# Altium schematic symbol library LUCHADOR SCHLIB.SchLib: 63 symbols (continued)
## LED0
designator D?
Typical INFRARED GaAs LED; Published: 8-Jun-2000; LatestRevisionDate: 08-Jul-2005; LatestRevisionNote: Mech Layer 1 removed.; PackageReference: LED-0; Publisher: Altium Limited; PackageDescription: LED; 2 Leads
footprint LED-0 (LED; 2 Leads)
simulation model LED0 (Diode)
pins: 1 A, 2 K

## LED0_1
designator D?  (value not drawn)
Typical INFRARED GaAs LED; Manufacturer: Vishay; Manufacturer Part Number: VLMO1500-GS08; Description1: Standard LEDs - SMD 0402 SOFT ORANGE Non-Diff; Illumination Color: Orange; Wavelength/Color Temperature: 605 nm; Luminous Intensity: 90 mcd; Viewing Angle: 130 deg; Lens Color/Style: Water Clear; If - Forward Current: 30 mA; Vf - Forward Voltage: 2 V; Power Rating: 75 mW; Brand: Vishay Semiconductors; Supplier 1: Digi-Key; Supplier Part Number 1: VLMO1500-GS08CT-ND; Stock 1: 194938; Pricing 1: 1=0.53, 10=0.38, 25=0.2916, 100=0.1901, 250=0.1394, 500=0.1183, 1000=0.0972 (USD); Product Category: Standard LEDs - SMD; RoHS: True; Package / Case: 0402 (1005 metric); Length: 1 mm; Height: 0.35 mm; Width: 0.5 mm; Minimum Operating Temperature: - 30 C; Maximum Operating Temperature: + 85 C; Series: VLMx; Packaging: Reel; Mounting Style: SMD/SMT; Factory Pack Quantity: 9000; Tradename: ChipLED; ComponentLink1URL: https://datasheet.ciiva.com/13945/vlmo1500-13945355.pdf; ComponentLink1Description: https://datasheet.ciiva.com/13945/vlmo1500-13945355.pdf; ComponentLink2URL: https://datasheet.ciiva.com/13945/vlmo1500-13945356.pdf; ComponentLink2Description: https://datasheet.ciiva.com/13945/vlmo1500-13945356.pdf; ComponentLink3URL: https://datasheet.ciiva.com/13945/vlmo1500-13945357.pdf; ComponentLink3Description: https://datasheet.ciiva.com/13945/vlmo1500-13945357.pdf
footprint 0402L-ORANGE (Footprint not found)
pins: 1 A, 2 K

## LED0_1_1
designator D31, comment STATUS
Typical INFRARED GaAs LED; Manufacturer: Vishay; Manufacturer Part Number: VLMO1500-GS08; Description1: Standard LEDs - SMD 0402 SOFT ORANGE Non-Diff; Illumination Color: Orange; Wavelength/Color Temperature: 605 nm; Luminous Intensity: 90 mcd; Viewing Angle: 130 deg; Lens Color/Style: Water Clear; If - Forward Current: 30 mA; Vf - Forward Voltage: 2 V; Power Rating: 75 mW; Brand: Vishay Semiconductors; Supplier 1: Digi-Key; Supplier Part Number 1: VLMO1500-GS08CT-ND; Stock 1: 194938; Pricing 1: 1=0.53, 10=0.38, 25=0.2916, 100=0.1901, 250=0.1394, 500=0.1183, 1000=0.0972 (USD); Product Category: Standard LEDs - SMD; RoHS: True; Package / Case: 0402 (1005 metric); Length: 1 mm; Height: 0.35 mm; Width: 0.5 mm; Minimum Operating Temperature: - 30 C; Maximum Operating Temperature: + 85 C; Series: VLMx; Packaging: Reel; Mounting Style: SMD/SMT; Factory Pack Quantity: 9000; Tradename: ChipLED; ComponentLink1URL: https://datasheet.ciiva.com/13945/vlmo1500-13945355.pdf; ComponentLink1Description: https://datasheet.ciiva.com/13945/vlmo1500-13945355.pdf; ComponentLink2URL: https://datasheet.ciiva.com/13945/vlmo1500-13945356.pdf; ComponentLink2Description: https://datasheet.ciiva.com/13945/vlmo1500-13945356.pdf; ComponentLink3URL: https://datasheet.ciiva.com/13945/vlmo1500-13945357.pdf; ComponentLink3Description: https://datasheet.ciiva.com/13945/vlmo1500-13945357.pdf
footprint 0402L-ORANGE (Footprint not found)
pins: 1 A, 2 K

## LM27762DSST
designator U?  Manufacturer Part Number: LM27762DSST
Manufacturer: Texas Instruments; Description1: Charge Pump Switching Regulator IC Positive and Negative (Dual Rail) Adjustable -5V, 1.5V 2 - Dual Output 250mA 12-WFDFN Exposed Pad; Function: Step-Up/Step-Down; Output Configuration: Positive and Negative (Dual Rail); Topology: Charge Pump; Output Type: Adjustable; Number of Outputs: 2 - Dual; Voltage - Input (Min): 2.7V; Voltage - Input (Max): 5.5V; Voltage - Output (Min/Fixed): -5V, 1.5V; Voltage - Output (Max): -1.5V, 5V; Current - Output: 250mA; Frequency - Switching: 1.7MHz ~ 2.3MHz; Synchronous Rectifier: No; Supplier 1: Digi-Key; Supplier Part Number 1: 296-44944-1-ND; Stock 1: 4423; Pricing 1: 1=2.43, 10=2.184, 100=1.7551 (USD); Category: Integrated Circuits (ICs); Family: PMIC - Voltage Regulators - DC DC Switching Regulators; Series: -; Packaging: Tape & Reel (TR); Part Status: Active; Operating Temperature: -40°C ~ 85°C (TA); Mounting Type: Surface Mount; Package / Case: 12-WFDFN Exposed Pad; Supplier Device Package: 12-WSON (3x2); ComponentLink1URL: http://www.ti.com/lit/ds/symlink/lm27762.pdf; ComponentLink1Description: http://www.ti.com/lit/ds/symlink/lm27762.pdf
footprint WFDFN-12 (Footprint not found)
pins: 1 PGOOD, 2 FB+, 3 VIN, 4 GND, 5 CP, 6 OUT-, 7 FB-, 8 EN-, 9 C1-, 10 C1+, 11 OUT+, 12 EN+, TP

## LTC1871EMS#TRPBF
designator U?
Manufacturer: Linear Technology; Description1: IC REG CTRLR MULT TOP 10MSOP; Output Type: Transistor Driver; Function: Step-Up, Step-Up/Step-Down; Output Configuration: Positive or Negative; Topology: Boost, Flyback, SEPIC; Number of Outputs: 1; Voltage - Supply (Vcc/Vdd): 2.5 V ~ 36 V; Frequency - Switching: 50kHz ~ 1MHz; Duty Cycle (Max): 92%; Synchronous Rectifier: No; Clock Sync: Yes; Control Features: Enable, Frequency Control; Supplier 1: Digi-Key; Supplier Part Number 1: LTC1871EMS#TRPBFCT-ND; RoHS: RoHS Compliant; Category: Integrated Circuits (ICs); Stock 1: 1092; Pricing 1: 1=6.19, 25=5.5276, 100=3.36, 250=3.08 (USD); Packaging: Cut Tape (CT); Part Status: Active; Output Phases: 1; Serial Interfaces: -; Operating Temperature: -40°C ~ 85°C (TA); Package / Case: 10-TFSOP, 10-MSOP (0.118", 3.00mm Width); Supplier Device Package: 10-MSOP; ComponentLink1URL: http://www.linear.com/docs/5240; ComponentLink1Description: http://www.linear.com/docs/5240; Manufacturer Part Number: LTC1871EMS#TRPBF
footprint MSOP-10 (Footprint not found)
pins: 1 RUN, 2 Ith, 3 FB, 4 FREQ, 5 MODE/SYNC, 6 GND (power), 7 GATE (out), 8 INTVcc (power), 9 Vin (power), 10 SENSE (in)

## M50-3552042
designator J?
Manufacturer: Harwin Inc.; Manufacturer Part Number: M50-3552042; Description1: 1.27 IDC PCB HEADER 40 POSN; Connector Type: Header, Shrouded; Number of Positions: 40; Number of Positions Loaded: All; Pitch: 0.050" (1.27mm); Supplier 1: Digi-Key; Supplier Part Number 1: 952-2622-ND; RoHS: RoHS Compliant; Category: Connectors, Interconnects; Stock 1: 139; Pricing 1: 1=4.16, 10=3.726, 100=3.0681, 500=2.42526, 1000=2.08193, 5000=1.8993, 10000=1.82625 (USD); Packaging: Tube; Part Status: Active; Contact Type: Male Pin; Number of Rows: 2; Row Spacing: 0.050" (1.27mm); Contact Mating Length: 0.120" (3.05mm); Mounting Type: Through Hole; Termination: Solder; Fastening Type: Latch Lock/Eject Hooks; Features: -; Contact Finish: Gold; Contact Finish Thickness: Flash; Color: Black; ComponentLink1URL: http://cdn.harwin.com/pdfs/M50-355.pdf; ComponentLink1Description: http://cdn.harwin.com/pdfs/M50-355.pdf
footprint M50-3552042 (Footprint not found)
pins: 1, 2, 3, 4, 5, 6, 7, 8, 9, 10, 11, 12, 13, 14, 15, 16, 17, 18, 19, 20, 21, 22, 23, 24, 25, 26, 27, 28, 29, 30, 31, 32, 33, 34, 35, 36, 37, 38, 39, 40

## MKL26Z256VLH4
designator U?
Manufacturer: Freescale Semiconductor - NXP; Description1: IC MCU 32BIT 256KB FLASH 64LQFP; Core Processor: ARM® Cortex®-M0+; Core Size: 32-Bit; Speed: 48MHz; Connectivity: I²C, LIN, SPI, UART/USART, USB, USB OTG; Peripherals: Brown-out Detect/Reset, DMA, I²S, LVD, POR, PWM, WDT; Number of I/O: 50; Program Memory Size: 256KB (256K x 8); Program Memory Type: FLASH; RAM Size: 32K x 8; Voltage - Supply (Vcc/Vdd): 1.71 V ~ 3.6 V; Data Converters: A/D - 16bit, D/A - 12bit; Oscillator Type: Internal; Supplier 1: Digi-Key; Supplier Part Number 1: MKL26Z256VLH4-ND; RoHS: RoHS Compliant; Category: Integrated Circuits (ICs); Stock 1: 578; Pricing 1: 1=4.12, 10=3.893, 25=3.664, 100=2.748 (USD); Packaging: Tray; Part Status: Active; EEPROM Size: -; Operating Temperature: -40°C ~ 105°C (TA); Package / Case: 64-LQFP; Supplier Device Package: 64-LQFP (10x10); ComponentLink1URL: http://cache.freescale.com/files/microcontrollers/doc/data_sheet/KL26P121M48SF4.pdf; ComponentLink1Description: http://cache.freescale.com/files/microcontrollers/doc/data_sheet/KL26P121M48SF4.pdf; Manufacturer Part Number: MKL26Z256VLH4
footprint LQFP-64 (Footprint not found)
part A pins: 1 UART1_TX, 2 UART1_RX, 9 UART0_TX, 10 UART0_RX, 11 UART2_TX, 12 UART2_RX, 17 PTE29, 18 PTE30, 19 PTE31, 20 PTE24, 21 PTE25, 23 PTA1, 24 PTA2, 26 PTA4, 27 PTA5, 28 PTA12, 29 PTA13, 32 PTA18, 33 PTA19, 35 PTB0/LLWU_P5, 36 PTB1, 37 PTB2, 38 PTB3, 39 PTB16, 40 PTB17, 41 PTB18, 42 PTB19, 43 PTC0, 44 PTC1/LLWU_P6/RTC_CLKIN, 45 PTC2, 46 PTC3/LLWU_P7, 49 SPI0_PCS0, 50 SPI0_SCK, 51 SPI0_MOSI, 52 SPI0_MISO, 53 PTC8, 54 PTC9, 55 PTC10, 56 PTC11, 57 PTD0, 58 PTD1, 59 PTD2, 60 PTD3, 61 PTD4/LLWU_P14, 62 PTD5, 63 PTD6/LLWU_P15, 64 PTD7
part B pins: 3 VDD, 4 VSS, 5 USB0_DP, 6 USB0_DM, 7 VOUT33, 8 VREGIN, 13 VDDA, 14 VREFH, 15 VREFL, 16 VSSA, 22 SWD_CLK, 25 SWD_DIO, 30 VDD, 31 VSS, 34 RESET_b, 47 VSS, 48 VDD

## NTMS7N03R2G
designator Q?
HEXFET Power MOSFET; Manufacturer: ON Semiconductor; Description1: MOSFET N-CH 30V 4.8A 8-SOIC; FET Type: MOSFET N-Channel, Metal Oxide; FET Feature: Logic Level Gate; Drain to Source Voltage (Vdss): 30V; Current - Continuous Drain (Id) @ 25°C: 4.8A (Ta); Rds On (Max) @ Id, Vgs: 23 mOhm @ 7A, 10V; Vgs(th) (Max) @ Id: 3V @ 250µA; Gate Charge (Qg) @ Vgs: 43nC @ 10V; Input Capacitance (Ciss) @ Vds: 1190pF @ 25V; Power - Max: 800mW; Supplier 1: Digi-Key; Supplier Part Number 1: NTMS7N03R2GOSCT-ND; RoHS: RoHS Compliant; Category: Discrete Semiconductor Products; Stock 1: 4882; Pricing 1: 1=0.8, 10=0.704, 100=0.5382, 500=0.42642, 1000=0.34155 (USD); Packaging: Cut Tape (CT); Part Status: Active; Operating Temperature: -55°C ~ 150°C (TJ); Mounting Type: Surface Mount; Package / Case: 8-SOIC (0.154", 3.90mm Width); Supplier Device Package: 8-SOIC; ComponentLink1URL: http://www.onsemi.com/pub_link/Collateral/NTMS7N03R2-D.PDF; ComponentLink1Description: http://www.onsemi.com/pub_link/Collateral/NTMS7N03R2-D.PDF; Manufacturer Part Number: NTMS7N03R2G
footprint SOIC-8 (Footprint not found)
pins: 1 S, 2 S, 3 S, 4 G, 5 D, 6 D, 7 D, 8 D

## OPA454AIDDAR
designator U?
Manufacturer: Texas Instruments; Description1: IC OPAMP GP 2.5MHZ 8SOPWRPAD; Amplifier Type: General Purpose; Number of Circuits: 1; Slew Rate: 13 V/µs; Gain Bandwidth Product: 2.5MHz; Current - Input Bias: 1.4pA; Voltage - Input Offset: 200µV; Current - Supply: 3.2mA; Current - Output / Channel: 150mA; Voltage - Supply, Single/Dual (±): 10 V ~ 100 V, ±5 V ~ 50 V; Supplier 1: Digi-Key; Supplier Part Number 1: 296-41370-1-ND; Manufacturer Part Number: OPA454AIDDAR; RoHS: RoHS Compliant; Category: Integrated Circuits (ICs); Stock 1: 3862; Pricing 1: 1=6.76, 10=6.064, 100=4.9748, 500=4.23226, 1000=3.09375 (USD); Packaging: Cut Tape (CT); Part Status: Active; Output Type: -; -3db Bandwidth: -; Operating Temperature: -40°C ~ 85°C; Mounting Type: Surface Mount; Package / Case: 8-PowerSOIC (0.154", 3.90mm Width); Supplier Device Package: 8-SO PowerPad; ComponentLink1URL: http://www.ti.com/lit/ds/symlink/opa454.pdf; ComponentLink1Description: http://www.ti.com/lit/ds/symlink/opa454.pdf
footprint SO-8 POWERPAD (Footprint not found)
pins: 1 E COM, 2 IN-, 3 IN+, 4 V-, 5 SF, 6 VOUT, 7 V+, 8 E, 9 PAD

## PA0367ANLT
designator T?
Transformer (Coupled Inductor Model); Manufacturer: Pulse Electronics Corporation; Chipset Manufacturer: Linear Technology; Description1: TRANSFORMER 18UH 1:12 SMD; Type: For DC/DC Converters; Intended Chipset: LT3420; Voltage - Isolation: 500Vrms; Published: 8-Jun-2000; LatestRevisionDate: 17-Jul-2002; LatestRevisionNote: Re-released for DXP Platform.; PackageReference: TRF_4; Publisher: Altium Limited; PackageDescription: Transformer; 4 Leads; Supplier 1: Digi-Key; Supplier Part Number 1: 553-1978-1-ND; RoHS: RoHS Compliant; Category: Transformers; Stock 1: 11156; Pricing 1: 1=4.24, 10=3.438, 25=2.7796, 50=2.6042, 100=2.4871 (USD); Packaging: Cut Tape (CT); Part Status: Active; Applications: Flyback Converters; Voltage - Primary: -; Voltage - Auxillary: -; Frequency: -; Operating Temperature: -40°C ~ 130°C; Mounting Type: Surface Mount; Size / Dimension: 11.68mm L x 11.68mm W; Height - Seated (Max): 5.20mm; ComponentLink1URL: http://media.digikey.com/pdf/Data%20Sheets/Pulse%20PDFs/PA0367A.pdf; ComponentLink1Description: http://media.digikey.com/pdf/Data%20Sheets/Pulse%20PDFs/PA0367A.pdf; Manufacturer Part Number: PA0367ANLT
footprint PA0367ANLT (Footprint not found)
pins: 1, 2, 3, 4
text: 1:12

## PTN04050AAZT
designator PS?  (value not drawn)
Manufacturer: Texas Instruments; Description1: REG SW POS-NEG 3.3V/5V 6W SMD; Number of Outputs: 1; Voltage - Input (Min): 2.9V; Voltage - Input (Max): 7V; Voltage - Output 1: -15 ~ -3.3 V; Current - Output (Max): 1A; Efficiency: 83%; Supplier 1: Digi-Key; Supplier Part Number 1: 296-32208-1-ND; Manufacturer Part Number: PTN04050AAZT; RoHS: RoHS Compliant; Category: Power Supplies - Board Mount; Stock 1: 1561; Pricing 1: 1=17.47, 5=17.334, 10=17.205, 25=16.944, 50=16.1618, 100=14.8585 (USD); Packaging: Cut Tape (CT); Part Status: Active; Type: Non-Isolated PoL Module; Voltage - Output 2: -; Voltage - Output 3: -; Power (Watts) - Manufacture Series: -; Voltage - Isolation: -; Applications: ITE (Commercial); Features: OCP, OTP, UVLO; Mounting Type: Surface Mount; Package / Case: 5-SMD Module; Size / Dimension: 0.87" L x 0.50" W x 0.36" H (22.1mm x 12.7mm x 9.1mm); Operating Temperature: -40°C ~ 85°C; Power (Watts) - Max: -; ComponentLink1URL: http://www.ti.com/lit/ds/symlink/ptn04050a.pdf; ComponentLink1Description: http://www.ti.com/lit/ds/symlink/ptn04050a.pdf
footprint PTN04050AAZT (Footprint not found)
pins: 1 GND (power), 2 Vi (power), 3 INHIBIT, 4 Vadj, 5 Vo (power)

## PVG5A502C03R00
designator R?  Resistance (Ohms): 5k  (hidden comment: PVG5A502C03R00)
Potentiometer; Manufacturer: Bourns Inc.; Description1: TRIMMER 5K OHM 0.25W SMD; Power (Watts): 0.25W, 1/4W; Tolerance: ±10%; Temperature Coefficient: ±150ppm/°C; Number of Turns: 11; Adjustment Type: Top Adjustment; Resistive Material: Cermet; Supplier 1: Digi-Key; Supplier Part Number 1: 490-2672-1-ND; Manufacturer Part Number: PVG5A502C03R00; RoHS: RoHS Compliant; Category: Potentiometers, Variable Resistors; Stock 1: 7183; Pricing 1: 1=3.04, 10=2.675, 25=2.4024, 50=2.3056, 100=2.2176 (USD); Packaging: Cut Tape (CT); Part Status: Active; Mounting Type: Surface Mount; Termination Style: J Lead; Size / Dimension: Rectangular - 0.189" x 0.138" Face x 0.201" H (4.80mm x 3.50mm x 5.10mm); ComponentLink1URL: http://www.bourns.com/docs/Product-Datasheets/pvg5.pdf; ComponentLink1Description: http://www.bourns.com/docs/Product-Datasheets/pvg5.pdf
footprint PVG5A502C03R00 (Footprint not found)
pins: 1 TOP, 2 TAP, 3 BOT

## QPC02SXGN-RC
designator JP?  (value not drawn)  (mechanical)
Manufacturer: Sullins; Manufacturer Part Number: QPC02SXGN-RC; Description1: CONN JUMPER SHORTING .100" GOLD; Gender: Female Sockets; Number of Positions or Pins (Grid): 2 (1 x 2); Pitch: 0.100" (2.54mm); Dynamic Catalog: Shunts and Jumpers - Sullins Connector Solutions; Other Names: S9337; Supplier 1: Digi-Key; Supplier Part Number 1: S9337-ND; Stock 1: 955884; Pricing 1: 1=0.1, 10=0.059, 25=0.044, 50=0.0378, 100=0.0365, 250=0.0315, 500=0.0302, 1000=0.0265, 2500=0.0239 (USD); Standard Package: 2,000; Category: Connectors, Interconnects; Family: Shunts, Jumpers; Type: Open Top; Height: 0.235" (5.97mm); Contact Finish: Gold; Contact Finish Thickness: Flash; Packaging: Bulk; ComponentLink1URL: https://s3.amazonaws.com/catalogspreads-pdf/PAGE128-129%20.100%20JUMPER.pdf; ComponentLink1Description: https://s3.amazonaws.com/catalogspreads-pdf/PAGE128-129%20.100%20JUMPER.pdf

## QS5K2TR
designator Q?
Manufacturer: Rohm Semiconductor; Description1: MOSFET 2N-CH 30V 2A TSMT5; FET Type: 2 N-Channel (Dual) Common Source; FET Feature: Logic Level Gate; Drain to Source Voltage (Vdss): 30V; Current - Continuous Drain (Id) @ 25°C: 2A; Rds On (Max) @ Id, Vgs: 100 mOhm @ 2A, 4.5V; Vgs(th) (Max) @ Id: 1.5V @ 1mA; Gate Charge (Qg) @ Vgs: 3.9nC @ 4.5V; Input Capacitance (Ciss) @ Vds: 175pF @ 10V; Power - Max: 1.25W; Supplier 1: Digi-Key; Supplier Part Number 1: QS5K2CT-ND; RoHS: RoHS Compliant; Category: Discrete Semiconductor Products; Stock 1: 208064; Pricing 1: 1=0.52, 10=0.449, 100=0.3352, 500=0.26332, 1000=0.203 (USD); Packaging: Cut Tape (CT); Part Status: Active; Operating Temperature: 150°C (TJ); Mounting Type: Surface Mount; Package / Case: SOT-23-5 Thin, TSOT-23-5; Supplier Device Package: TSMT5; ComponentLink1URL: http://rohmfs.rohm.com/en/products/databook/datasheet/discrete/transistor/mosfet/qs5k2.pdf; ComponentLink1Description: http://rohmfs.rohm.com/en/products/databook/datasheet/discrete/transistor/mosfet/qs5k2.pdf; Manufacturer Part Number: QS5K2TR
footprint SOT-23-5 (Footprint not found)
pins: 1 G1, 2 S, 3 G2, 4 D2, 5 D1

## R05-100B
designator PS?, comment ISOLATED DC/DC
Manufacturer: Recom Power; Manufacturer Part Number: R05-100B; Power (Watts) - Manufacture Series: 5W; Description1: DC/DC CONV INNOLINE ADJUSTABLE; Number of Outputs: 1; Voltage - Input (Min): 4.5V; Voltage - Input (Max): 6V; Voltage - Output 1: 40 ~ 120 V; Current - Output (Max): 25mA; Voltage - Isolation: 3kV (3000V); Efficiency: 77%; Power (Watts) - Max: 3W; Supplier 1: Digi-Key; Supplier Part Number 1: 945-2051-5-ND; RoHS: RoHS Compliant; Category: Power Supplies - Board Mount; Stock 1: 145; Pricing 1: 1=42.45, 5=42.116, 15=41.78467, 30=40.45833, 60=38.4685, 105=35.81552, 250=35.28492 (USD); Packaging: Tube; Part Status: Active; Type: Isolated Module; Voltage - Output 2: -; Voltage - Output 3: -; Applications: ITE (Commercial); Features: SCP; Mounting Type: Through Hole; Package / Case: 24-DIP Module; Size / Dimension: 1.25" L x 0.80" W x 0.37" H (31.8mm x 20.3mm x 9.4mm); Operating Temperature: -40°C ~ 85°C; ComponentLink1URL: http://www.recom-power.com/pdf/Innoline/Rxx-B.pdf; ComponentLink1Description: http://www.recom-power.com/pdf/Innoline/Rxx-B.pdf
footprint R05-100B (Footprint not found)
pins: 2 VIN- (power), 3 VIN- (power), 8 VADJ, 9 VREF, 10 COM (power), 12 VOUT, 13 VOUT (power), 15 COM (power), 16 VREF, 17 VADJ, 22 +VIN (power), 23 +VIN (power)

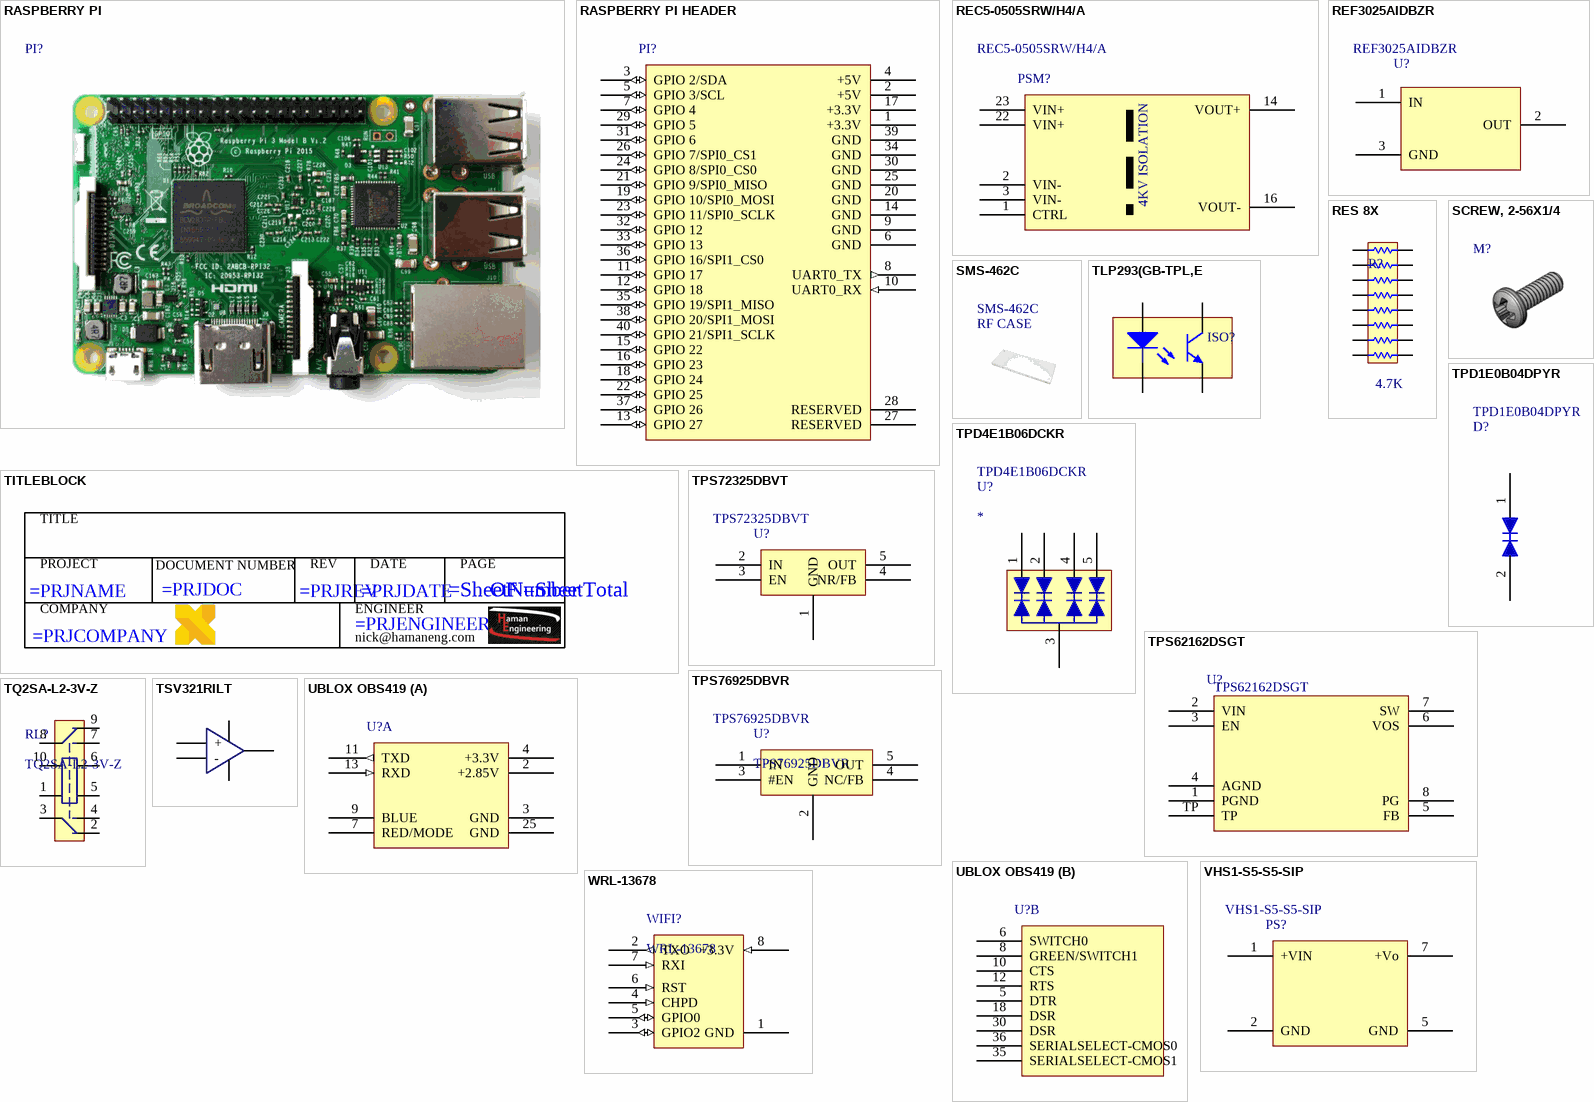
[diagram p2: symbols RASPBERRY PI to WRL-13678]

## RASPBERRY PI
designator PI?  (value not drawn)  (mechanical)
Manufacturer: Raspberry Pi; Description1: SINGLE BOARD COMPUTER 1.2GHZ 1GB; Board Type: Single Board Computer; Core Processor: ARM® Cortex®-A53, VideoCore; Platform: Raspberry Pi 3 Model B; For Use With/Related Products: BCM2837; Contents: Board(s); Supplier 1: Digi-Key; Supplier Part Number 1: 1690-1000-ND; RoHS: Not Applicable; Category: Development Boards, Kits, Programmers; Stock 1: 139; Pricing 1: 1=47.5 (USD); Part Status: Active; Type: MPU; Operating System: -; Mounting Type: Fixed; ComponentLink1URL: http://media.digikey.com/pdf/Data%20Sheets/Raspberry%20Pi%20PDFs/Raspberrypi_PI_3_Model_B_Web.pdf; ComponentLink1Description: http://media.digikey.com/pdf/Data%20Sheets/Raspberry%20Pi%20PDFs/Raspberrypi_PI_3_Model_B_Web.pdf

## RASPBERRY PI HEADER
designator PI?  (value not drawn)
Manufacturer: Samtec Inc.; Manufacturer Part Number: ESQ-120-12-G-D; Description1: CONN RCPT 40POS .100" DUAL GOLD; Connector Type: Receptacle; Number of Positions: 40; Number of Positions Loaded: All; Pitch: 0.100" (2.54mm); Supplier 1: Digi-Key; Supplier Part Number 1: SAM8766-ND; RoHS: RoHS Compliant; Category: Connectors, Interconnects; Stock 1: 513; Pricing 1: 1=7.25, 10=6.615, 50=5.67, 100=5.04, 250=4.56752, 500=4.2525, 1000=4.01625, 2500=3.85875, 5000=3.78 (USD); Packaging: Tube; Part Status: Active; Contact Type: Female Socket; Number of Rows: 2; Row Spacing: 0.100" (2.54mm); Mounting Type: Through Hole; Termination: Solder; Fastening Type: -; Features: -; Contact Finish: Gold; Contact Finish Thickness: 20µin (0.51µm); Color: Black; ComponentLink1URL: http://suddendocs.samtec.com/prints/esq-1xx-xx-x-x-xxx-xx-x-xx-mkt.pdf; ComponentLink1Description: http://suddendocs.samtec.com/prints/esq-1xx-xx-x-x-xxx-xx-x-xx-mkt.pdf
footprint SAMTEC ESQ-120-12-G-D
pins: 1 +3.3V (power), 2 +5V (power), 3 GPIO 2/SDA (io), 4 +5V (power), 5 GPIO 3/SCL (io), 6 GND (power), 7 GPIO 4 (io), 8 UART0_TX (out), 9 GND (power), 10 UART0_RX (in), 11 GPIO 17 (io), 12 GPIO 18 (io), 13 GPIO 27 (io), 14 GND (power), 15 GPIO 22 (io), 16 GPIO 23 (io), 17 +3.3V (power), 18 GPIO 24 (io), 19 GPIO 10/SPI0_MOSI (io), 20 GND (power), 21 GPIO 9/SPI0_MISO (io), 22 GPIO 25 (io), 23 GPIO 11/SPI0_SCLK (io), 24 GPIO 8/SPI0_CS0 (io), 25 GND (power), 26 GPIO 7/SPI0_CS1 (io), 27 RESERVED, 28 RESERVED, 29 GPIO 5 (io), 30 GND (power), 31 GPIO 6 (io), 32 GPIO 12 (io), 33 GPIO 13 (io), 34 GND (power), 35 GPIO 19/SPI1_MISO (io), 36 GPIO 16/SPI1_CS0 (io), 37 GPIO 26 (io), 38 GPIO 20/SPI1_MOSI (io), 39 GND (power), 40 GPIO 21/SPI1_SCLK (io)

## REC5-0505SRW/H4/A
designator PSM?  Manufacturer Part Number: REC5-0505SRW/H4/A  (hidden comment: *)
Manufacturer: Recom; Power (Watts) - Manufacture Series: 5W; Description1: DC/DC converter 4.5. . .9 VDC 5 VDC 5 W, REC5-0505SRW/H4/A, Recom; Product Training Modules: Purpose of DC/DC Converters; Number of Outputs: 1; Voltage - Input (Min): 4.5V; Voltage - Input (Max): 9V; Voltage - Output 1: 5V; Current - Output (Max): 1A; Voltage - Isolation: 4kV (4000V); Efficiency: 72%; Online Catalog: Econoline REC5 Series; Other Names: 10004451 945-1164 REC50505SRW/H4/A REC50505SRWH4A; Supplier 1: Digi-Key; Stock 1: 1716; Pricing 1: 1=22.3, 5=22.124, 10=21.952, 25=21.6092, 50=20.58, 100=18.865, 250=18.522, 500=18.2476 (USD); Standard Package: 15; Category: Power Supplies - Board Mount; Family: DC DC Converters; Series: ECONOLINE REC5; Packaging: Tube; Type: Isolated Module; Voltage - Output 2: -; Voltage - Output 3: -; Features: SCP; Mounting Type: Through Hole; Package / Case: 24-DIP Module (8 Leads); Size / Dimension: 1.26" L x 0.80" W x 0.40" H (32.0mm x 20.3mm x 10.2mm); Operating Temperature: -40°C ~ 75°C; Power (Watts) - Max: 5W; ComponentLink1URL: https://datasheet.ciiva.com/3356/cgrec5-s-drw-h4-h6-3356747.pdf; ComponentLink1Description: https://datasheet.ciiva.com/3356/cgrec5-s-drw-h4-h6-3356747.pdf; ComponentLink2URL: https://datasheet.ciiva.com/14573/70052057-14573838.pdf; ComponentLink2Description: https://datasheet.ciiva.com/14573/70052057-14573838.pdf; Supplier Part Number 1: 945-1164-ND
footprint REC5-0505SRW/H4/A
pins: 1 CTRL, 2 VIN-, 3 VIN-, 14 VOUT+, 16 VOUT-, 22 VIN+, 23 VIN+
text: 4KV ISOLATION

## REF3025AIDBZR
designator U?  Manufacturer Part Number: REF3025AIDBZR  (hidden comment: *)
Manufacturer: Texas Instruments; Manufacturer Product Page: REF3025AIDBZR Specifications; Description1: IC VREF SERIES 2.5V SOT23-3; Product Training Modules: Selecting Voltage References; Reference Type: Series; Output Type: Fixed; Voltage - Output (Min/Fixed): 2.5V; Current - Output: 25mA; Tolerance: ±0.2%; Temperature Coefficient: 75ppm/°C; Noise - 0.1Hz to 10Hz: 28µVp-p; Noise - 10Hz to 10kHz: 80µVrms; Voltage - Input: 2.55 V ~ 5.5 V; Current - Supply: 50µA; Online Catalog: Series, Fixed - Texas Instruments; Other Names: 296-26322-1; Supplier 1: Digi-Key; Supplier Part Number 1: 296-26322-1-ND; Stock 1: 53687; Pricing 1: 1=1.43, 10=1.282, 100=0.9997, 500=0.8259, 1000=0.652 (USD); Standard Package: 1; Category: Integrated Circuits (ICs); Family: PMIC - Voltage Reference; Series: -; Packaging: Cut Tape (CT); Voltage - Output (Max): -; Current - Cathode: -; Operating Temperature: -40°C ~ 125°C (TA); Mounting Type: Surface Mount; Package / Case: TO-236-3, SC-59, SOT-23-3; Supplier Device Package: SOT-23-3; ComponentLink1URL: https://datasheet.ciiva.com/2012/ref3012-2012418.pdf; ComponentLink1Description: https://datasheet.ciiva.com/2012/ref3012-2012418.pdf; ComponentLink2URL: https://datasheet.ciiva.com/27052/1493492-27052290.pdf; ComponentLink2Description: https://datasheet.ciiva.com/27052/1493492-27052290.pdf; ComponentLink3URL: https://datasheet.ciiva.com/2012/ref3012-2012419.pdf; ComponentLink3Description: https://datasheet.ciiva.com/2012/ref3012-2012419.pdf; ComponentLink4URL: https://datasheet.ciiva.com/2012/ref3012-2012420.pdf; ComponentLink4Description: https://datasheet.ciiva.com/2012/ref3012-2012420.pdf; ComponentLink5URL: https://datasheet.ciiva.com/15149/getdatasheetpartid-253850-15149190.pdf; ComponentLink5Description: https://datasheet.ciiva.com/15149/getdatasheetpartid-253850-15149190.pdf; ComponentLink6URL: https://datasheet.ciiva.com/3236/sbvs032f-3236285.pdf; ComponentLink6Description: https://datasheet.ciiva.com/3236/sbvs032f-3236285.pdf
footprint SOT-23 (SOT-23; 3 Leads; Body 3.0 x 2.6 mm, inc. leads (LxW max))
pins: 1 IN, 2 OUT, 3 GND

## RES 8X
designator R?  Resistance: 4.7K  (hidden comment: RES 8X)
Resistor; Manufacturer: Panasonic; Manufacturer Part Number: EXB-2HV472JV; Description1: Res Thick Film Array 4.7K Ohm 5% 1/4W ±200ppm/°C ISOL 16-Pin 1506(8 X 0402) Convex SMD Punched Carrier T/R; No of Elements: 8; Tolerance (%): ±5 %; Power Dissipation: 0.063 W; Voltage Rating: 50 V; Supplier 1: Digi-Key; Supplier Part Number 1: Y1472CT-ND; Stock 1: 49295; Pricing 1: 1=0.29, 10=0.248, 25=0.1804, 50=0.1308, 100=0.097, 250=0.0744, 500=0.0586, 1000=0.0406 (USD); Case Size: 0402 (1005 Metric); ComponentLink1URL: https://datasheet.ciiva.com/19466/1387876-19466987.pdf; ComponentLink1Description: https://datasheet.ciiva.com/19466/1387876-19466987.pdf; ComponentLink2URL: https://datasheet.ciiva.com/28636/1790599-28636958.pdf; ComponentLink2Description: https://datasheet.ciiva.com/28636/1790599-28636958.pdf; ComponentLink3URL: https://datasheet.ciiva.com/30089/aoc0000ce1-30089086.pdf; ComponentLink3Description: https://datasheet.ciiva.com/30089/aoc0000ce1-30089086.pdf
footprint 1506R (Footprint not found)
pins: A1, A2, A3, A4, A5, A6, A7, A8, B1, B2, B3, B4, B5, B6, B7, B8

## SCREW, 2-56X1/4
designator M?  (value not drawn)  (mechanical)
MANUFACTURER: MCMASTER-CARR; MANUFACTURER PART NUMBER: 90272A077; DESCRIPTION 1: SCREW, 2-56X1/4; SUPPLIER 1: MCMASTER-CARR; SUPPLIER PART NUMBER 1: 90272A077

## SMS-462C
designator RF CASE  Manufacturer Part Number: SMS-462C  (hidden comment: *)  (mechanical)
Manufacturer: Leader Tech FerriShield; Description1: LEADER TECH-FERRISHIELD         SMS-462C             SURFACE MOUNT SHIELD COVER, RECT                          New; Supplier 1: Digi-Key; Supplier Part Number 1: 1798-1236-ND; Stock 1: 778; Pricing 1: 1=0.93, 10=0.816, 25=0.7224, 100=0.6291, 250=0.5476, 500=0.466, 1000=0.3728, 2500=0.3379, 5000=0.3146 (USD)

## TITLEBLOCK
designator *  (value not drawn)  (graphical)
text: TITLE; PROJECT; DOCUMENT NUMBER; REV; DATE; PAGE; OF; COMPANY; ENGINEER; nick@hamaneng.com

## TLP293(GB-TPL,E
designator ISO?  (value not drawn)
Manufacturer: Toshiba Semiconductor and Storage; Description1: OPTOISOLATOR 3.75KV TRANS 4-SO; Number of Channels: 1; Voltage - Isolation: 3750Vrms; Current Transfer Ratio (Min): 100% @ 5mA; Current Transfer Ratio (Max): 600% @ 5mA; Turn On / Turn Off Time (Typ): 3µs, 3µs; Rise / Fall Time (Typ): 2µs, 3µs; Input Type: DC; Output Type: Transistor; Voltage - Output (Max): 80V; Current - Output / Channel: 50mA; Voltage - Forward (Vf) (Typ): 1.25V; Vce Saturation (Max): 300mV; Supplier 1: Digi-Key; Supplier Part Number 1: TLP293(GB-TPLECT-ND; Manufacturer Part Number: TLP293(GB-TPL,E; RoHS: RoHS Compliant; Category: Isolators; Stock 1: 25586; Pricing 1: 1=0.52, 10=0.377, 25=0.308, 100=0.2464, 250=0.20792, 500=0.1771, 1000=0.1386 (USD); Packaging: Cut Tape (CT); Part Status: Active; Current - DC Forward (If) (Max): 50mA; Operating Temperature: -55°C ~ 125°C; Mounting Type: Surface Mount; Package / Case: 4-SOIC (0.179", 4.55mm); Supplier Device Package: 4-SO; ComponentLink1URL: https://toshiba.semicon-storage.com/info/docget.jsp?did=14419&prodName=TLP293; ComponentLink1Description: https://toshiba.semicon-storage.com/info/docget.jsp?did=14419&prodName=TLP293
footprint SO-4 (Footprint not found)
pins: 1 A, 2 K, 3 E, 4 C

## TPD1E0B04DPYR
designator D?  Manufacturer Part Number: TPD1E0B04DPYR  (hidden comment: *)
Manufacturer: Texas Instruments; Supplier 1: Digi-Key; Supplier Part Number 1: 296-47864-1-ND; Stock 1: 6850; Pricing 1: 1=0.43, 10=0.346, 100=0.2353, 500=0.1765, 1000=0.1324 (USD)
footprint 0402D (Footprint not found)
pins: 1 IO1, 2 GND

## TPD4E1B06DCKR
designator U?  Manufacturer Part Number: TPD4E1B06DCKR
Manufacturer: Texas Instruments; Description1: TVS DIODE 5.5VWM 14.5VC SC70-6; Direction Type: Uni-Directional; Maximum Clamping Voltage: 15(Typ) V; Number of Elements per Chip: 4; ESD Protection Voltage: ±18@Air Gap/±18@Contact Disc kV; Maximum Working Voltage: 5.5 V; Maximum Leakage Current: 0.01 uA; Capacitance Value: 1 pF; Supplier 1: Digi-Key; Supplier Part Number 1: 296-39346-1-ND; Stock 1: 120901; Pricing 1: 1=0.61, 10=0.519, 100=0.3876, 500=0.3046, 1000=0.2353 (USD); Type: Diode Arrays; Pin Count: 6; Minimum Operating Temperature: -40 °C; Maximum Operating Temperature: 125 °C; Mounting: Surface Mount; Category: ESD Suppressors; ComponentLink1URL: https://datasheet.ciiva.com/12545/tpd4e1b06-224687-12545147.pdf; ComponentLink1Description: https://datasheet.ciiva.com/12545/tpd4e1b06-224687-12545147.pdf; ComponentLink2URL: https://datasheet.ciiva.com/6574/tpd4e1b06-6574671.pdf; ComponentLink2Description: https://datasheet.ciiva.com/6574/tpd4e1b06-6574671.pdf
footprint SC70-6 (Footprint not found)
pins: 1 IO1, 2 IO2, 3 GND, 4 IO3, 5 IO4

## TPS62162DSGT
designator U?  Manufacturer Part Number: TPS62162DSGT  (hidden comment: *)
Manufacturer: Texas Instruments; Description1: IC REG BUCK 3.3V 1A SYNC 8WSON; Featured Product: Create your power design now with TI’s WEBENCH® Designer; EDA / CAD Models: Download from Accelerated Designs; Function: Step-Down; Output Configuration: Positive; Topology: Buck; Output Type: Fixed; Number of Outputs: 1; Voltage - Input (Min): 3V; Voltage - Input (Max): 17V; Voltage - Output (Min/Fixed): 3.3V; Current - Output: 1A; Frequency - Switching: 2.25MHz; Synchronous Rectifier: Yes; Online Catalog: Buck (Step-Down) IC; Related Products: 732-2614-2-ND  - FIXED IND 3.3UH 1.5A 101 MOHM 732-2614-1-ND  - FIXED IND 3.3UH 1.5A 101 MOHM 732-2614-6-ND  - FIXED IND 3.3UH 1.5A 101 MOHM; Other Names: 296-29897-2; Supplier 1: Digi-Key; Supplier Part Number 1: 296-29897-1-ND; Stock 1: 13573; Pricing 1: 1=2.15, 10=1.932, 100=1.5533 (USD); Standard Package: 250; Category: Integrated Circuits (ICs); Family: PMIC - Voltage Regulators - DC DC Switching Regulators; Series: DCS-Control™; Packaging: Tape & Reel (TR); Voltage - Output (Max): -; Operating Temperature: -40°C ~ 85°C (TA); Mounting Type: Surface Mount; Package / Case: 8-WFDFN Exposed Pad; Supplier Device Package: 8-WSON (2x2); ComponentLink1URL: https://datasheet.ciiva.com/2026/tps62160-2026052.pdf; ComponentLink1Description: https://datasheet.ciiva.com/2026/tps62160-2026052.pdf; ComponentLink2URL: https://datasheet.ciiva.com/2026/tps62160-2026053.pdf; ComponentLink2Description: https://datasheet.ciiva.com/2026/tps62160-2026053.pdf; ComponentLink3URL: https://datasheet.ciiva.com/2026/tps62160-2026054.pdf; ComponentLink3Description: https://datasheet.ciiva.com/2026/tps62160-2026054.pdf; ComponentLink4URL: https://datasheet.ciiva.com/46425/1857528-46425721.pdf; ComponentLink4Description: https://datasheet.ciiva.com/46425/1857528-46425721.pdf; ComponentLink5URL: https://datasheet.ciiva.com/46425/1857528-46425722.pdf; ComponentLink5Description: https://datasheet.ciiva.com/46425/1857528-46425722.pdf; ComponentLink6URL: https://datasheet.ciiva.com/46425/1857528-46425743.pdf; ComponentLink6Description: https://datasheet.ciiva.com/46425/1857528-46425743.pdf
footprint WFDFN-8 (Footprint not found)
pins: 1 PGND, 2 VIN, 3 EN, 4 AGND, 5 FB, 6 VOS, 7 SW, 8 PG, TP

## TPS72325DBVT
designator U?
Manufacturer: Texas Instruments; Description1: IC REG LDO -2.5V 0.2A SOT23-5; Regulator Topology: Negative Fixed; Voltage - Output: -2.5V; Current - Output: 200mA; Voltage - Dropout (Typical): 0.28V @ 200mA; Number of Regulators: 1; Voltage - Input: -2.7 V ~ -10 V; Current - Limit (Min): 300mA; Supplier 1: Digi-Key; Supplier Part Number 1: 296-15799-1-ND; RoHS: RoHS Compliant; Category: Integrated Circuits (ICs); Stock 1: 1408; Pricing 1: 1=3.07, 10=2.756, 100=2.2613 (USD); Packaging: Cut Tape (CT); Part Status: Active; Operating Temperature: -40°C ~ 125°C; Mounting Type: Surface Mount; Package / Case: SC-74A, SOT-753; Supplier Device Package: SOT-23-5; ComponentLink1URL: http://www.ti.com/lit/ds/symlink/tps723.pdf; ComponentLink1Description: http://www.ti.com/lit/ds/symlink/tps723.pdf; Manufacturer Part Number: TPS72325DBVT
footprint SOT-23-5 (Footprint not found)
pins: 1 GND (power), 2 IN (power), 3 EN, 4 NR/FB, 5 OUT (power)

## TPS76925DBVR
designator U?
Manufacturer: Texas Instruments; Description1: IC REG LDO 2.5V 0.1A SOT23-5; Regulator Topology: Positive Fixed; Voltage - Output: 2.5V; Current - Output: 100mA; Number of Regulators: 1; Voltage - Input: 2.7 V ~ 10 V; Supplier 1: Digi-Key; Supplier Part Number 1: 296-11035-1-ND; RoHS: RoHS Compliant; Category: Integrated Circuits (ICs); Stock 1: 9031; Pricing 1: 1=0.87, 10=0.775, 100=0.6044, 500=0.4998, 1000=0.39525 (USD); Packaging: Cut Tape (CT); Part Status: Active; Voltage - Dropout (Typical): -; Current - Limit (Min): -; Operating Temperature: -40°C ~ 125°C; Mounting Type: Surface Mount; Package / Case: SC-74A, SOT-753; Supplier Device Package: SOT-23-5; ComponentLink1URL: http://www.ti.com/lit/ds/symlink/tps769.pdf; ComponentLink1Description: http://www.ti.com/lit/ds/symlink/tps769.pdf; Manufacturer Part Number: TPS76925DBVR
footprint SOT-23-5 (Footprint not found)
pins: 1 IN (power), 2 GND (power), 3 #EN, 4 NC/FB, 5 OUT (power)

## TQ2SA-L2-3V-Z
designator RL?
Manufacturer: Panasonic Electric Works; Description1: RELAY TELECOM DPDT 2A 3V; Relay Type: Telecom; Coil Type: Latching, Dual Coil; Coil Current: 46.7mA; Coil Voltage: 3VDC; Contact Form: DPDT (2 Form C); Contact Rating (Current): 2A; Switching Voltage: 125VAC, 220VDC - Max; Turn On Voltage (Max): 2.25 VDC; Operate Time: 4ms; Coil Power: 140 mW; Coil Resistance: 64.3 Ohms; Supplier 1: Digi-Key; Supplier Part Number 1: 255-3465-1-ND; Manufacturer Part Number: TQ2SA-L2-3V-Z; RoHS: RoHS Compliant; Category: Relays; Stock 1: 6585; Pricing 1: 1=4.48, 25=4.1176, 50=3.66, 100=3.111 (USD); Packaging: Cut Tape (CT); Part Status: Active; Turn Off Voltage (Min): -; Release Time: 4ms; Features: -; Mounting Type: Surface Mount; Termination Style: Gull Wing; Contact Material: Silver Nickel (AgNi), Gold (Au); Operating Temperature: -40°C ~ 85°C; ComponentLink1URL: http://www3.panasonic.biz/ac/e_download/control/relay/signal/catalog/mech_eng_tq.pdf; ComponentLink1Description: http://www3.panasonic.biz/ac/e_download/control/relay/signal/catalog/mech_eng_tq.pdf
footprint TQ2SA-L2-3V-Z (Footprint not found)
pins: 1, 2, 3, 4, 5, 6, 7, 8, 9, 10

## TSV321RILT
designator U?  (value not drawn)
Manufacturer: STMicroelectronics; Manufacturer Part Number: TSV321RILT; Description1: IC OPAMP GP 1.4MHZ RRO SOT23-5; Amplifier Type: General Purpose; Output Type: Rail-to-Rail; Slew Rate: 0.6 V/µs; Current - Supply: 500µA; Voltage - Supply, Single/Dual (±): 2.5 V ~ 6 V; Supplier 1: Digi-Key; Supplier Part Number 1: 497-8164-1-ND; RoHS: RoHS Compliant; Category: Integrated Circuits (ICs); Stock 1: 75819; Pricing 1: 1=0.58, 10=0.494, 100=0.3692, 500=0.29004, 1000=0.22413 (USD); Packaging: Cut Tape (CT); Part Status: Active; Operating Temperature: -40°C ~ 125°C; Mounting Type: Surface Mount; Package / Case: SC-74A, SOT-753; Supplier Device Package: SOT-23-5; Base Part Number: TSV321; ComponentLink1URL: http://www.st.com/content/ccc/resource/technical/document/datasheet/4c/37/c9/ed/ee/b0/44/6d/CD00063292.pdf/files/CD00063292.pdf/jcr:content/translations/en.CD00063292.pdf; ComponentLink1Description: http://www.st.com/content/ccc/resource/technical/document/datasheet/4c/37/c9/ed/ee/b0/44/6d/CD00063292.pdf/files/CD00063292.pdf/jcr:content/translations/en.CD00063292.pdf
footprint SOT-23-5 (5-Lead Plastic SOT-23)
pins: 1 OUT, 2 VDD, 3 +, 4 -, 5 VCC

## UBLOX OBS419
designator U?  (value not drawn)
footprint OSB419
part A pins: 2 +2.85V, 3 GND, 4 +3.3V, 7 RED/MODE, 9 BLUE, 11 TXD (out), 13 RXD (in), 25 GND
part B pins: 5 DTR, 6 SWITCH0, 8 GREEN/SWITCH1, 10 CTS, 12 RTS, 18 DSR, 30 DSR, 35 SERIALSELECT-CMOS1, 36 SERIALSELECT-CMOS0

## VHS1-S5-S5-SIP
designator PS?  Manufacturer Part Number: VHS1-S5-S5-SIP  (hidden comment: *)
Manufacturer: CUI; Power (Watts) - Manufacture Series: 1W; Description1: CONVERTER DC/DC 5V OUT 1W; Product Training Modules: Low Power DC-DC Converters EMI Regulations and Mitigation Considerations for Switching Power Supplies Reliability Considerations for Power Supplies Power Supply Safety Standards, Agencies and Marks Thermal Management of Power Supplies; Other Drawings: VHS1-SIP Series Bottom VHS1-SIP Series Side; Number of Outputs: 1; Voltage - Input (Min): 4.5V; Voltage - Input (Max): 5.5V; Voltage - Output 1: 5V; Current - Output (Max): 200mA; Voltage - Isolation: 6kV (6000V); Efficiency: 72%; Online Catalog: VHS1-SIP Series; Other Names: 102-1449  656-90111R  VHS1S5S5SIP; Supplier 1: Digi-Key; Supplier Part Number 1: 102-1449-ND; Stock 1: 18932; Pricing 1: 1=8.47, 5=8.35, 12=8.2283, 36=7.9861, 60=7.744, 108=7.502, 252=7.26, 504=6.776 (USD); RoHS Information: VHS1-SIP Series  Cert of Compliance; 3D Model: VHS1-S5-S5-SIP; Standard Package: 25; Category: Power Supplies - Board Mount; Family: DC DC Converters; Series: VHS1-SIP; Packaging: -; Type: Isolated Module; Voltage - Output 2: -; Voltage - Output 3: -; Applications: Medical; Features: SCP; Mounting Type: Through Hole; Package / Case: 7-SIP Module (4 Leads); Size / Dimension: 0.77" L x 0.39" W x 0.49" H (19.5mm x 9.8mm x 12.5mm); Operating Temperature: -40°C ~ 85°C; Power (Watts) - Max: 1W
footprint ISOLATED MODULE (Footprint not found)
pins: 1 +VIN, 2 GND, 5 GND, 7 +Vo

## WRL-13678
designator WIFI?
Manufacturer: SparkFun Electronics; Description1: WIFI MODULE - ESP8266 W/1M FLASH; RF Family/Standard: WiFi; Protocol: 802.11b/g/n; Frequency: 2.4GHz ~ 2.48GHz; Data Rate: 54Mbps; Power - Output: 19.5dBm; Sensitivity: -98dBm; Serial Interfaces: SPI, UART; Antenna Type: Integrated, Trace; Memory Size: 1MB Flash; Voltage - Supply: 3.6V; Current - Receiving: 62mA; Current - Transmitting: 215mA; Supplier 1: Digi-Key; Supplier Part Number 1: 1568-1235-ND; Manufacturer Part Number: WRL-13678; RoHS: RoHS Compliant; Category: RF/IF and RFID; Stock 1: 666; Pricing 1: 1=6.95 (USD); Packaging: Bulk; Part Status: Active; Modulation: -; Mounting Type: Through Hole; Operating Temperature: -; Package / Case: Module; ComponentLink1URL: https://nurdspace.nl/images/e/e0/ESP8266_Specifications_English.pdf; ComponentLink1Description: https://nurdspace.nl/images/e/e0/ESP8266_Specifications_English.pdf
footprint WRL-13678 (Footprint not found)
pins: 1 GND (power), 2 TXO (out), 3 GPIO2 (io), 4 CHPD (in), 5 GPIO0 (io), 6 RST (in), 7 RXI (in), 8 +3.3V (in)